# Altium footprint library UZ_D_Encoder.PcbLib: 45 footprints (part 1 of 3)
Each footprint in its own frame and in the unit in brackets; x right, y up, seen from the top. Pads: shape width x height; smd on the part's side, far side on the other; paste and mask are expansions set on the pad; w line width, h text height; cw(c..) or ccw(c..) is an arc to the next point about the centre after c.
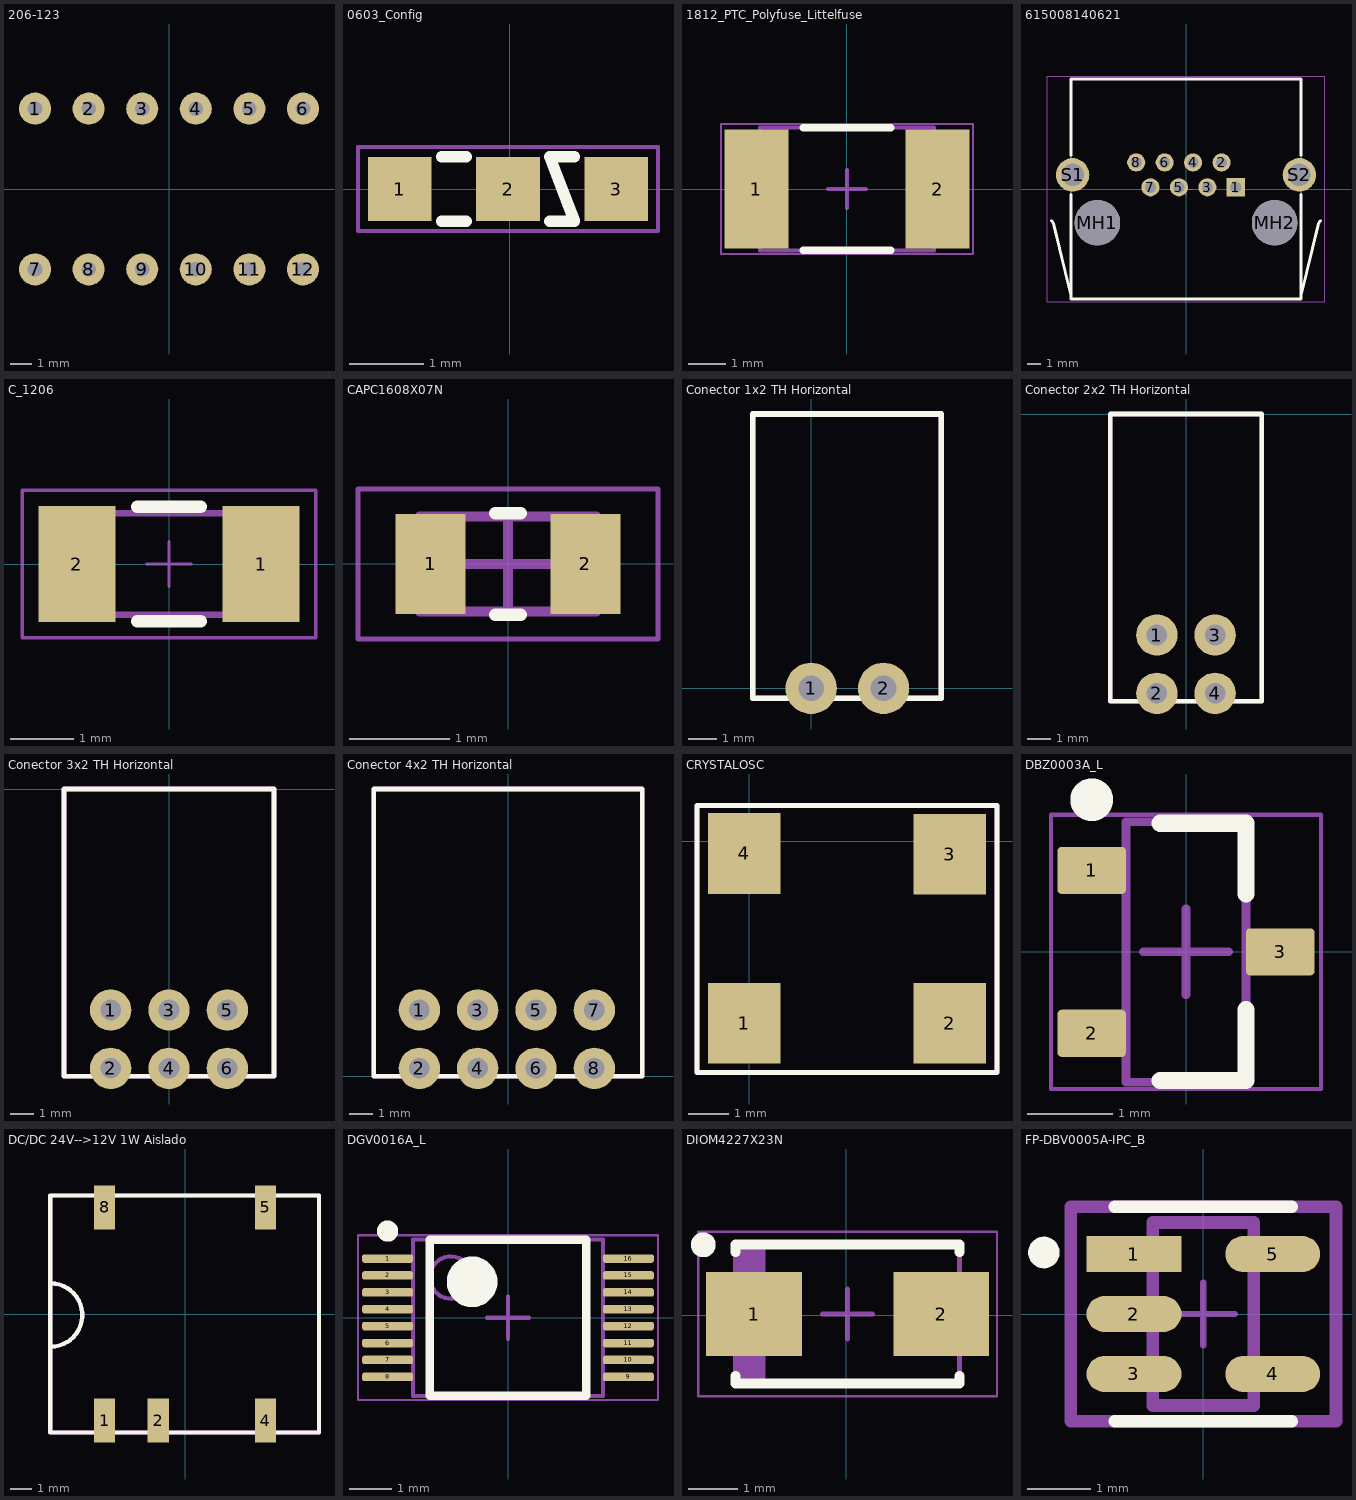
[diagram p0: the footprints below, top view; thin cyan lines are the x and y axes]

## 206-123 [mil]
pads (12):
  round 60 hole 27.56: 1(-250,150) 2(-150,150) 3(-50,150) 4(50,150) 5(150,150) 6(250,150) 7(-250,-150) 8(-150,-150) 9(-50,-150) 10(50,-150) 11(150,-150) 12(250,-150)
3D body "206-6.STEP": height 334.18, standoff -150.78, extent -342.05,-188.41 343.95,191.59

## 0603_Config [mm] "0603 3-Pin Config Footprint"
height 1
pads (3):
  rect 0.85x0.85 smd: 1(-1.475,0) 2(-0.025,0) 3(1.425,0)
Top Overlay:
  lines w0.152: -0.914,-0.432 -0.584,-0.432 ; -0.914,0.432 -0.584,0.432 ; 0.533,-0.432 0.864,-0.432 0.533,0.432 0.864,0.432
Top Assembly:
  lines w0.054: -2.032,-0.559 -2.032,0.559 1.981,0.559 1.981,-0.559 -2.032,-0.559
  text ".Designator" at -1.824,-0.112 h0.64
3D body "User Library-RESC1608X___.STEP": height 0.3, standoff 0, extent -1.55,-0.4 0.05,0.4

## 1812_PTC_Polyfuse_Littelfuse [mm] "Chip Fuse, 2-Leads, Body 4.6x3.24mm"
height 1.6
pads (2):
  rect 1.68x3.14 smd: 1(-2.39,0) 2(2.39,0)
Top Overlay:
  lines w0.2: -1.15,-1.62 1.15,-1.62 ; -1.15,1.62 1.15,1.62
Top Assembly:
  lines w0.1: -2.3,-1.62 -2.3,1.62 2.3,1.62 2.3,-1.62 -2.3,-1.62
  text ".Designator" at -0.901,-0.725 h1.52
Mechanical 15:
  lines w0.05: -3.33,-1.72 3.33,-1.72 3.33,1.72 -3.33,1.72 -3.33,-1.72
  lines w0.1: -0.5,0 0.5,0 ; 0,-0.5 0,0.5
3D body "mf-msmf110_24x.stp": height 1.15, standoff 0, extent -2.3,-1.62 2.3,1.62

## 615008140621 [mm] "Modular Jack Horizontal Shielded with EMI Panel Finger 8P8C Tab Up"
height 13.25
pads (12):
  rect 1.3x1.3 hole 0.8: 1(3.57,0.125)
  round 1.3 hole 0.8: 2(2.55,1.905) 3(1.53,0.125) 4(0.51,1.905) 5(-0.51,0.125) 6(-1.53,1.905) 7(-2.55,0.125) 8(-3.57,1.905)
  round 3.25 hole 3.25 unplated: MH1(-6.35,-2.415) MH2(6.35,-2.415)
  round 2.4 hole 1.6: S1(-8.125,1.015) S2(8.125,1.015)
Top Overlay:
  lines w0.2: -9.64,-2.27 cw(c-10.1,-2.729) -9.462,-2.609 -8.25,-7.58 ; -8.25,-0.385 -8.25,-7.875 8.25,-7.875 8.25,-0.385 ; -8.25,2.415 -8.25,7.875 8.25,7.875 8.25,2.415 ; 8.25,-7.58 9.462,-2.609 cw(c10.1,-2.729) 9.64,-2.27
Top Assembly:
  lines w0.1: -9.64,-2.27 cw(c-10.1,-2.729) -9.462,-2.609 -8.25,-7.58 ; 8.25,-7.58 9.462,-2.609 cw(c10.1,-2.729) 9.64,-2.27 ; -8.25,-7.875 8.25,-7.875 8.25,7.875 -8.25,7.875 -8.25,-7.875
  text ".Designator" at -1.578,10.692 h2
Mechanical 15:
  lines w0.05: -0.5,0 0.5,0 ; 0,-0.5 0,0.5 ; -9.95,-8.075 9.95,-8.075 9.95,8.075 -9.95,8.075 -9.95,-8.075
3D body "615008140621 (rev1).stp": height 14.82, standoff -3.42, extent -9.75,-7.875 9.75,7.975

## C_1206 [mm]
height 1.8
pads (2):
  rect 1.21x1.82 smd: 1(1.45,0) 2(-1.45,0)
Top Overlay:
  lines w0.2: -0.5,-0.9 0.5,-0.9 ; -0.5,0.9 0.5,0.9
Top Assembly:
  lines w0.1: -1.1,-0.8 -1.1,0.8 ; 1.1,-0.8 1.1,0.8 ; -1.6,-0.8 1.6,-0.8 1.6,0.8 -1.6,0.8 -1.6,-0.8
  text ".Designator" at -0.924,-0.112 h0.64
Mechanical 15:
  lines w0.05: -0.35,0 0.35,0 ; 0,-0.35 0,0.35 ; -2.31,-1.16 -2.31,1.16 2.31,1.16 2.31,-1.16 -2.31,-1.16
3D body "User Library-CAPC3216X___CAPC3216X180N.STEP": height 1.82, standoff 0, extent -1.6,-0.81 1.6,0.81

## CAPC1608X07N [mm] "Chip Capacitor, 2-Leads, Body 1,60x0,80mm, IPC Medium Density"
height 0.7
pads (2):
  rect 0.7x1 smd: 1(-0.775,0) 2(0.775,0)
Top Overlay:
  lines w0.127: -0.127,-0.508 0.127,-0.508 ; -0.127,0.508 0.127,0.508
Top Assembly:
  lines w0.1: -0.885,-0.475 0.885,-0.475 0.885,0.475 -0.885,0.475 -0.885,-0.475
  text ".Designator" at 1.076,-0.212 h0.64
Mechanical 15:
  lines w0.05: -1.5,-0.75 -1.5,0.75 1.5,0.75 1.5,-0.75 -1.5,-0.75
  lines w0.1: -0.475,0 0.475,0 ; 0,-0.475 0,0.475
3D body: height 0.7, standoff 0, extent 0.435,-0.475 0.885,0.475
3D body: height 0.7, standoff 0, extent -0.435,-0.475 0.435,0.475
3D body: height 0.7, standoff 0, extent -0.885,-0.475 -0.435,0.475

## Conector 1x2 TH Horizontal [mm] "Pitch 2.54mm P/N: IPL1-102-01-S-S-RA-K"
pads (2):
  round 1.8 hole 0.9: 1(0,0) 2(2.54,0)
Top Overlay:
  lines w0.2: -2.044,-0.345 4.56,-0.345 4.56,9.625 -2.044,9.625 -2.044,-0.345
Top Assembly:
  lines w0.2: -2.044,-0.345 -2.044,9.625 4.56,9.625 4.56,-0.345 -2.044,-0.345
  text ".Designator" at 0.905,3.767 h2
3D body "Conector 1x2 TH Horizontal - IPL1-102-01-S-S-RA-K.stp": height 7.06, standoff -1.71, extent -2.044,-0.345 4.56,9.625

## Conector 2x2 TH Horizontal [mm] "Pitch 2.54mm P/N: IPL1-102-01-L-D-RA-K"
pads (4):
  round 1.8 hole 0.9: 1(-1.27,-9.628) 2(-1.27,-12.168) 3(1.27,-9.628) 4(1.27,-12.168)
Top Overlay:
  lines w0.2: -3.302,-12.509 -3.302,0 3.302,0 3.302,-12.509 -3.302,-12.509
Top Assembly:
  lines w0.2: -3.302,-12.509 3.302,-12.509 3.302,0 -3.302,0 -3.302,-12.509
  text ".Designator" at 0.553,-11.684 h2
3D body "Conector 2x2 TH Horizontal - IPL1-102-01-L-D-RA-K.stp": height 8.19, standoff -1.84, extent -3.302,-12.509 3.302,0

## Conector 3x2 TH Horizontal [mm] "Pitch 2.54mm P/N: IPL1-103-01-L-D-RA-K"
pads (6):
  round 1.8 hole 0.9: 1(-2.54,-9.628) 2(-2.54,-12.168) 3(0,-9.628) 4(0,-12.168) 5(2.54,-9.628) 6(2.54,-12.168)
Top Overlay:
  lines w0.2: -4.572,-12.509 -4.572,0 4.572,0 4.572,-12.509 -4.572,-12.509
Top Assembly:
  lines w0.2: -4.572,-12.509 4.572,-12.509 4.572,0 -4.572,0 -4.572,-12.509
  text ".Designator" at 0.604,-11.633 h2
3D body "Conector 3x2 TH Horizontal - IPL1-103-01-L-D-RA-K.stp": height 8.19, standoff -1.84, extent -4.572,-12.509 4.572,0

## Conector 4x2 TH Horizontal [mm] "Pitch 2.54mm P/N: IPL1-104-01-L-D-RA-K"
pads (8):
  round 1.8 hole 0.9: 1(-3.86,2.881) 2(-3.86,0.341) 3(-1.32,2.881) 4(-1.32,0.341) 5(1.22,2.881) 6(1.22,0.341) 7(3.76,2.881) 8(3.76,0.341)
Top Overlay:
  lines w0.2: -5.842,0 5.842,0 5.842,12.509 -5.842,12.509 -5.842,0
Top Assembly:
  lines w0.2: -5.842,0 -5.842,12.509 5.842,12.509 5.842,0 -5.842,0
  text ".Designator" at 0.604,1.041 h2
3D body "Conector 4x2 TH Horizontal - IPL1-104-01-L-D-RA-K.stp": height 8.19, standoff -1.84, extent -5.842,0 5.842,12.509

## CRYSTALOSC [mm]
pads (4):
  rect 1.8x2 smd: 1(-0.12,-4.5) 2(4.96,-4.5) 3(4.96,-0.32) 4(-0.12,-0.3)
Top Overlay:
  lines w0.127: -1.29,-5.72 6.13,-5.72 6.13,0.89 -1.29,0.89 -1.29,-5.72
  text "." at -1.79,-4.82 h3
Top Assembly:
  lines w0.127: -1.29,-5.72 -1.29,0.89 6.13,0.89 6.13,-5.72 -1.29,-5.72
  text "." at -1.79,-4.82 h3
  text ".Designator" at 4.754,-2.261 h2
3D body "oscilador 50MHz.step": height 1.7, standoff 0, extent -1.04,-4.861 5.96,0.141

## DBZ0003A_L [mm] "SOT23, 3-Leads, Body 3.04x1.4mm, Pitch 0.95mm, IPC High Density"
height 1.12
pads (3):
  rrect18% 0.8x0.55 smd: 1(-1.1,0.95) 2(-1.1,-0.95) 3(1.1,0)
Top Overlay:
  circle w0.25: c-1.1,1.775 r0.125
  lines w0.2: -0.3,-1.5 0.7,-1.5 0.7,-0.675 ; -0.3,1.5 0.7,1.5 0.7,0.675
Top Assembly:
  text ".Designator" at -0.7,0 h0.35
Mechanical 13:
  lines w0.1: -0.7,-1.52 -0.7,1.52 0.7,1.52 0.7,-1.52 -0.7,-1.52
Mechanical 15:
  lines w0.05: -1.575,-1.6 -1.575,1.6 1.575,1.6 1.575,-1.6 -1.575,-1.6
  lines w0.1: -0.5,0 0.5,0 ; 0,-0.5 0,0.5
3D body "DBZ0003AakaMF03A.stp": height 0.96, standoff -0.02, extent -1.257,-1.461 1.257,1.46

## DC/DC 24V-->12V 1W Aislado [mm] "CUI Inc. P/N: PDS1-S24-S12-M-TR"
pads (5):
  rect 1x2.1 smd: 1(-3.81,-5.05) 2(-1.27,-5.05) 4(3.81,-5.05) 5(3.81,5.05) 8(-3.81,5.05)
Top Overlay:
  lines w0.2: -6.37,-1.55 ccw(c-6.37,-0.05) -6.37,1.45 ; -6.39,-5.622 -6.39,5.62 6.35,5.62 6.35,-5.622 -6.39,-5.622
Top Assembly:
  lines w0.2: -6.37,-1.55 ccw(c-6.37,-0.05) -6.37,1.45 ; -6.39,-5.622 -6.39,5.62 6.35,5.62 6.35,-5.622 -6.39,-5.622
  text ".Designator" at -3.624,-0.657 h2
3D body "CUI_PDS1-S24-S12-M.step": height 7, standoff -0.25, extent -6.35,-5.622 6.35,5.622

## DGV0016A_L [mm] "SOP, 16-Leads, Body 4.5x3.7mm, Pitch 0.4mm, IPC High Density"
height 1.2
pads (16):
  rrect50% 1.2x0.2 smd: 1(-2.85,1.4) 2(-2.85,1) 3(-2.85,0.6) 4(-2.85,0.2) 5(-2.85,-0.2) 6(-2.85,-0.6) 7(-2.85,-1) 8(-2.85,-1.4) 9(2.85,-1.4) 10(2.85,-1) 11(2.85,-0.6) 12(2.85,-0.2) 13(2.85,0.2) 14(2.85,0.6) 15(2.85,1) 16(2.85,1.4)
Top Overlay:
  circle w0.6: c-0.85,0.85 r0.3
  circle w0.25: c-2.85,2.05 r0.125
  lines w0.2: -1.85,-1.85 1.85,-1.85 1.85,1.85 -1.85,1.85 -1.85,-1.85
Top Assembly:
  text ".Designator" at -0.762,-0.381 h0.7
Mechanical 13:
  circle w0.1: c-1.35,0.95 r0.5
  lines w0.1: -2.25,-1.85 2.25,-1.85 2.25,1.85 -2.25,1.85 -2.25,-1.85
Mechanical 15:
  lines w0.05: -3.55,-1.95 3.55,-1.95 3.55,1.95 -3.55,1.95 -3.55,-1.95
  lines w0.1: -0.5,0 0.5,0 ; 0,-0.5 0,0.5
3D body: height 1.2, standoff 0.05, extent -2.25,-1.85 2.25,1.85

## DIOM4227X23N [mm] "Molded Diode, 2-Leads, Body 4,25x2,67mm, IPC Medium Density"
pads (2):
  rect 1.92x1.68 smd: 1(-1.854,0.023) 2(1.906,0.023)
Top Overlay:
  circle w0.25: c-2.874,1.413 r0.125
  lines w0.2: -2.224,-1.217 -2.224,-1.377 2.276,-1.377 2.276,-1.217 ; -2.224,1.263 -2.224,1.423 2.276,1.423 2.276,1.263
Top Assembly:
  rectangle: -2.224,-1.372 -1.619,1.418
  lines w0.1: -2.224,-1.372 2.276,-1.372 2.276,1.418 -2.224,1.418 -2.224,-1.372
  text ".Designator" at 0.941,0.229 h1
Mechanical 15:
  lines w0.05: -2.974,-1.627 3.026,-1.627 3.026,1.673 -2.974,1.673 -2.974,-1.627
  lines w0.1: -0.474,0.023 0.526,0.023 ; 0.026,-0.477 0.026,0.523
3D body "DIOM4227X23N.step": height 2.29, standoff 0, extent -2.444,-1.372 2.496,1.418

## FP-DBV0005A-IPC_B [mm]
pads (5):
  rect 1.505x0.572 smd paste+0 mask+0: 1(-1.1,0.95)
  rrect100% 1.505x0.572 smd paste+0 mask+0: 2(-1.1,0) 3(-1.1,-0.95) 4(1.1,-0.95) 5(1.1,0.95)
Top Overlay:
  circle w0.25: c-2.528,0.975 r0.125
  lines w0.2: -1.4,-1.7 1.4,-1.7 ; -1.4,1.7 1.4,1.7
Top 3D Body:
  lines w0.2: -0.8,-1.45 0.8,-1.45 0.8,1.45 -0.8,1.45 -0.8,-1.45
Top Assembly:
  lines w0.2: -2.103,-1.7 2.103,-1.7 2.103,1.7 -2.103,1.7 -2.103,-1.7
  text ".Designator" at 0,0 h1
Top Courtyard:
  lines w0.2: -2.103,-1.7 2.103,-1.7 2.103,1.7 -2.103,1.7 -2.103,-1.7
Top Component Center:
  lines w0.1: -0.5,0 0.5,0 ; 0,-0.5 0,0.5
3D body "IC_Texas_Instruments_SN74AHC1G00DBVR_eec.STEP": height 0.25, standoff 0, extent -2.103,-1.7 2.103,1.7